# Altium schematic symbol library BARKO_SCHLIB.SchLib: 1064 symbols (part 8 of 11)
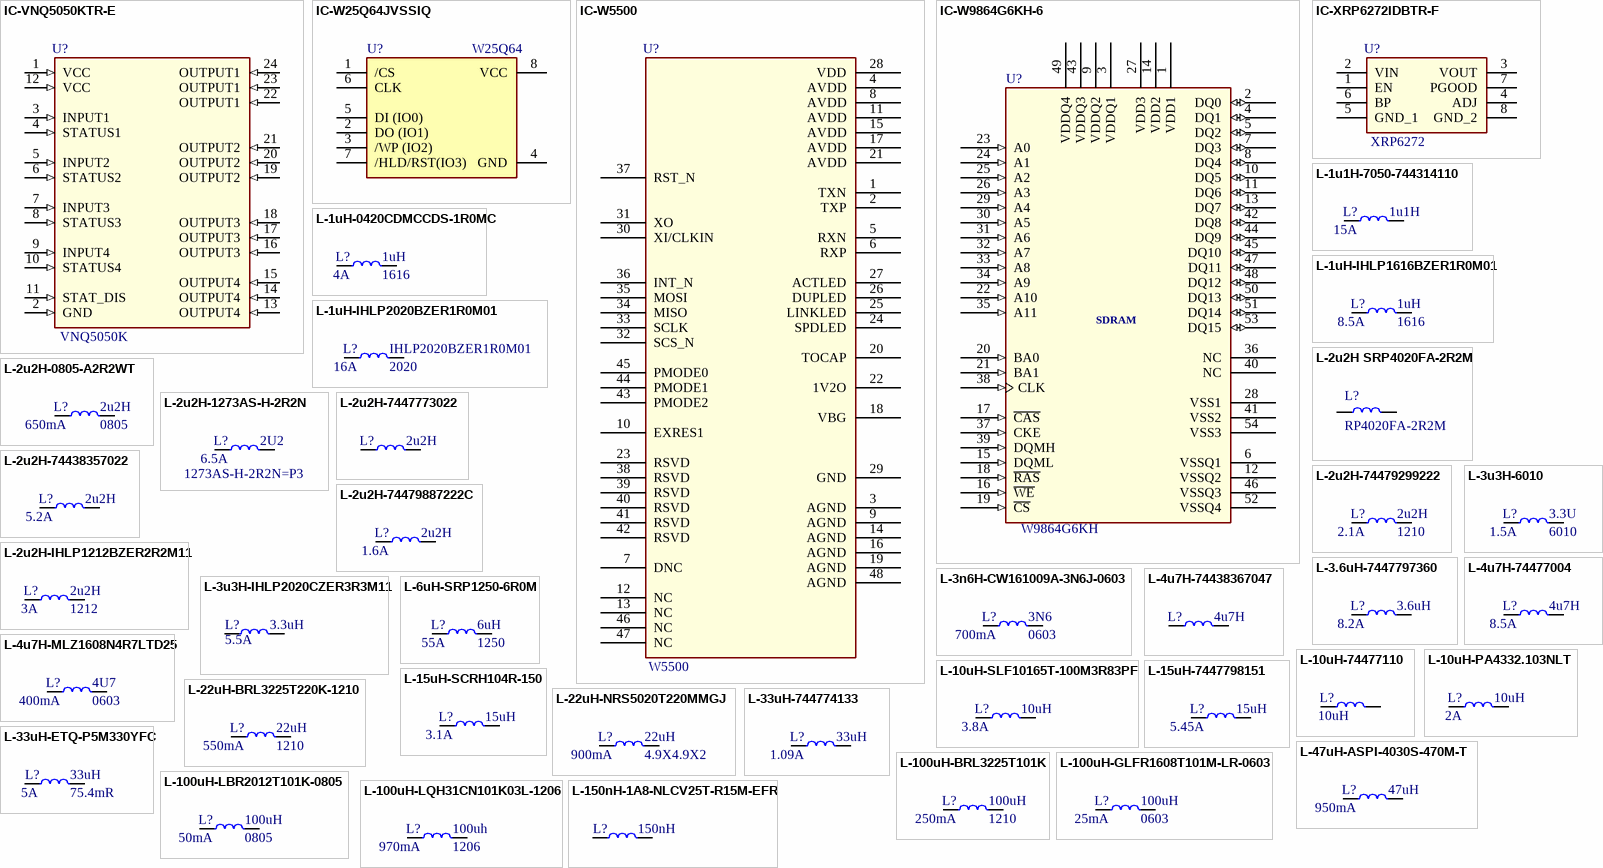
[diagram p48: symbols IC-VNQ5050KTR-E to L-150nH-1A8-NLCV25T-R15M-EFR]

## L-3u3H-IHLP2020CZER3R3M11
designator L?, comment 3.3uH  RMS Current (Irms): 5.5A
Inductor Power Shielded Wirewound 3.3uH 20% 100KHz 5.5A 35mOhm DCR 2020 T/R; Manufacturer: Vishay Dale; Manufacturer Part Number: IHLP2020CZER3R3M11; DC Resistance (DCR): 40.4mR; Saturation Current: 7A; Self Resonant Frequency: 29MHz; Supplier 1: Future Electronics; Stock 1: 8000; Pricing 1: 2000=0,95000 (USD); RoHS: Yes; Mount: Surface Mount; Case/Package: 2020; Contact Plating: Tin; Min Operating Temperature: -55°C; Max Operating Temperature: 125°C; Tolerance: 20%; Inductance: 3.3uH; Inductance Tolerance: 20%; Shielding: Shielded; Package Quantity: 2000; Current Rating: 5.5A; Packaging: Tape and Reel; Test Frequency: 100kHz; Max DC Current: 7A; Termination: SMD/SMT; Military Standard: Not; Length: 5.74mm; Height: 3mm; Depth: 5.43mm; Width: 0.204inch; Height - Seated (Max): 0.118inch; Radiation Hardening: No; Lead Free: Lead Free; REACH SVHC: Unknown; ComponentLink1URL: https://datasheet.ciiva.com/11798/0900766b8102c930-11798349.pdf?src-supplier=RSComponents; ComponentLink1Description: https://datasheet.ciiva.com/11798/0900766b8102c930-11798349.pdf?src-supplier=RSComponents; ComponentLink2URL: https://datasheet.ciiva.com/1051/lp20cz11-1051685.pdf?src-supplier=Digi-Key; ComponentLink2Description: https://datasheet.ciiva.com/1051/lp20cz11-1051685.pdf?src-supplier=Digi-Key; ComponentLink3URL: https://datasheet.ciiva.com/1051/lp20cz11-1051686.pdf?src-supplier=Digi-Key; ComponentLink3Description: https://datasheet.ciiva.com/1051/lp20cz11-1051686.pdf?src-supplier=Digi-Key; ComponentLink4URL: https://datasheet.ciiva.com/3081/lp20cz11-3081961.pdf?src-supplier=Avnet; ComponentLink4Description: https://datasheet.ciiva.com/3081/lp20cz11-3081961.pdf?src-supplier=Avnet; ComponentLink5URL: https://datasheet.ciiva.com/4956/lp20cz11-270739-4956265.pdf?src-supplier=Mouser; ComponentLink5Description: https://datasheet.ciiva.com/4956/lp20cz11-270739-4956265.pdf?src-supplier=Mouser; ComponentLink6URL: https://datasheet.ciiva.com/1051/lp20cz11-1051684.pdf?src-supplier=Digi-Key; ComponentLink6Description: https://datasheet.ciiva.com/1051/lp20cz11-1051684.pdf?src-supplier=Digi-Key; ComponentLink7URL: https://datasheet.ciiva.com/28641/480942-28641646.pdf?src-supplier=Element14; ComponentLink7Description: https://datasheet.ciiva.com/28641/480942-28641646.pdf?src-supplier=Element14; Supplier Part Number 1: IHLP2020CZER3R3M11-REEL
footprint L-IHLP2020CZ (Precision Wire Wound Inductor, 2-Leads, Body 5,49x5,18mm, IPC Medium Density)
pins: 1, 2

## L-4u7H-74477004
designator L?, comment 4u7H  Current Rating: 8.5A
FIXED IND 4.7UH 8.5A 16 MOHM SMD; Manufacturer 1: Wurth Electronics; Manufacturer Part Number: 74477004; Core Material: Ferrite; Saturation Current: 9.3A; Tolerance: 40%; Shielding: Shielded; DC Resistance (DCR): 16mR; Test Frequency: 1kHz; Self Resonant Frequency: 31.2MHz; .Creator: M.OZKAN; .PCBCHK: USED; Supplier 1: Digi-Key; Supplier Part Number 1: 732-1221-1-ND; RoHS: Yes; Category: Fixed Inductors; Stock: 3849; Pricing: 1=2,25000, 10=2,10000, 50=1,95000, 100=1,78000, 250=1,59000 (USD); Mount: Surface Mount; Case/Package: Nonstandard; Number of Pins: 2; Weight: 0.01lb; Min Operating Temperature: -40°C; Max Operating Temperature: 125°C; Package Quantity: 500; Packaging: Cut Tape; Inductance: 4.7uH; Inductance Tolerance: 40%; Composition: Wirewound; Max DC Current: 8.5A; Termination: SMD/SMT; RMS Current (Irms): 8.5A; Resistance: 16mR; Series Resistance: 16mR; Length: 12mm; Height: 8mm; Width: 12mm; Height - Seated (Max): 0.315inch; Depth: 12mm; REACH SVHC: Unknown; Lead Free: Lead Free; ComponentLink1URL: https://datasheet.ciiva.com/6690/74477004-6690625.pdf?src-supplier=Digi-Key; ComponentLink1Description: https://datasheet.ciiva.com/6690/74477004-6690625.pdf?src-supplier=Digi-Key; ComponentLink2URL: https://datasheet.ciiva.com/11800/0900766b80021589-11800145.pdf?src-supplier=RSComponents; ComponentLink2Description: https://datasheet.ciiva.com/11800/0900766b80021589-11800145.pdf?src-supplier=RSComponents; ComponentLink3URL: https://datasheet.ciiva.com/4963/74477004-61358-4963287.pdf?src-supplier=Mouser; ComponentLink3Description: https://datasheet.ciiva.com/4963/74477004-61358-4963287.pdf?src-supplier=Mouser; ComponentLink4URL: https://datasheet.ciiva.com/6171/69559-6171354.pdf?src-supplier=Farnell; ComponentLink4Description: https://datasheet.ciiva.com/6171/69559-6171354.pdf?src-supplier=Farnell; ComponentLink5URL: https://datasheet.ciiva.com/7754/74477004-7754621.pdf?src-supplier=Element14; ComponentLink5Description: https://datasheet.ciiva.com/7754/74477004-7754621.pdf?src-supplier=Element14; .SCHCHK: USED
footprint WE-PD_1280 (SMT Shielded Power Inductor, 2-leads, body 12x12mm)
pins: 1, 2

## L-4u7H-74438367047
designator L?, comment 4u7H
FIXED IND 4.7UH 5.5A 34.5MOHM; Manufacturer: Wurth Electronics; Manufacturer Part Number: 74438367047; Supplier 1: Digi-Key; Supplier Part Number 1: 732-74438367047CT-ND; Stock: 930; Pricing: 1=1.95, 10=1.77, 50=1.62, 100=1.48 (USD); RoHS: No
footprint WE-MAPI_5030 (SMD Power Inductor, 2-leads, body 5.6x5.6mm)
pins: 1, 2

## L-4u7H-MLZ1608N4R7LTD25
designator L?, comment 4U7  Current Rating: 400mA  Case Code (Imperial): 0603
FIXED IND 4.7UH 400MA 416 MOHM; Manufacturer: TDK; Manufacturer Part Number: MLZ1608N4R7LTD25; Core Material: Ferrite; Saturation Current: 80mA; Shielding: Shielded; Tolerance: 20%; DC Resistance (DCR): 416mR; Test Frequency: 2MHz; .Creator: F:TALI; .PCBCHK: USED; Washability: OK; Supplier 1: Digi-Key; Stock 1: 8425; Pricing 1: 1=0.22, 10=0.202, 100=0.1346, 500=0.11212, 1000=0.09419 (USD); Mount: Surface Mount; Case/Package: 0603; Weight: 0.000141oz; Case Code (Metric): 1608; Min Operating Temperature: -55°C; Max Operating Temperature: 125°C; Package Quantity: 4000; Packaging: Tape and Reel; Inductance: 4.7uh; Termination: SMD/SMT; Max DC Current: 400mA; Length: 0.063inch; Height: 0.8mm; Width: 0.031inch; Height - Seated (Max): 0.037inch; Ratings: AEC-Q200; Supplier Part Number 1: 445-17071-6-ND; .SCHCHK: USED
footprint L-0603
pins: 1, 2

## L-6uH-SRP1250-6R0M
designator L?, comment Saturation Current: 55A  Case/Package: 1250  (hidden comment: 6uH)
FIXED IND 6UH 9.5A 10 MOHM SMD; Manufacturer: Bourns; Manufacturer Part Number: SRP1250-6R0M; Core Material: Ferrite; Tolerance: 20%; DC Resistance (DCR): 10mR; Shielding: Shielded; Test Frequency: 100kHz; Current: 36A; .PCBCHK: USED; .Creator: F:TALI; Washability: OK; Supplier 1: Digi-Key; Stock 1: 0; Mount: Surface Mount; Number of Pins: 2; Material: Ferrite; Min Operating Temperature: -55°C; Max Operating Temperature: 150°C; Max DC Current: 9.5A; Package Quantity: 500; Packaging: Tape and Reel; Current Rating: 9.5A; Inductance Tolerance: 20%; Termination: SMD/SMT; RMS Current (Irms): 9.5A; Length: 13.9mm; Height: 5.2mm; Depth: 13.5mm; Width: 13.5mm; Radiation Hardening: No; REACH SVHC: No SVHC; ComponentLink1URL: http://components.arrow.com/part/dataview/45912965S9677445N1506; ComponentLink1Description: http://components.arrow.com/part/dataview/45912965S9677445N1506; ComponentLink2URL: http://bourns.com/pdfs/SRP1250.pdf; ComponentLink2Description: http://bourns.com/pdfs/SRP1250.pdf; ComponentLink3URL: http://www.farnell.com/datasheets/1727865.pdf; ComponentLink3Description: http://www.farnell.com/datasheets/1727865.pdf; ComponentLink4URL: http://www.produktinfo.conrad.com/datenblaetter/1000000-1099999/001056478-da-01-en-MAG_ABG_HC_L_IND_SRP1250_6R0M_6UH_9_5A.pdf; ComponentLink4Description: http://www.produktinfo.conrad.com/datenblaetter/1000000-1099999/001056478-da-01-en-MAG_ABG_HC_L_IND_SRP1250_6R0M_6UH_9_5A.pdf; Supplier Part Number 1: SRP1250-6R0M-ND; .SCHCHK: USED; Inductance: 6uH
footprint L- SRP1250
pins: 1, 2

## L-10uH-74477110
designator L?, comment 10UH
FIXED IND 10UH 5A 25 MOHM SMD; Manufacturer: Wurth Electronics; Manufacturer Part Number: 74477110; Washability: NO; Core Material: Ferrite; Tolerance: 20%; Shielding: Shielded; DC Resistance (DCR): 25mR; Test Frequency: 1kHz; Self Resonant Frequency: 21.5MHz; Saturation Current: 5.5A; Supplier 1: RSComponents; Stock 1: 31; Pricing 1: 1=3.72000, 10=3.45200, 100=2.85700, 500=2.22400, 1000=2.07100, 1=28.61500, 10=26.55000, 100=21.97800, 500=17.11000, 1000=15.93000 (EUR); RoHS: Yes; Mount: Surface Mount; Case/Package: Nonstandard; Weight: 0.01lb; Min Operating Temperature: -40°C; Max Operating Temperature: 125°C; Inductance Tolerance: 20%; Package Quantity: 500; Current Rating: 5A; Packaging: Tape and Reel; Max DC Current: 5A; Termination: SMD/SMT; Resistor Type: Wirewound; RMS Current (Irms): 5A; Resistance: 25mR; Series Resistance: 25mR; Length: 12mm; Width: 12mm; Height: 6mm; Height - Seated (Max): 0.236inch; Depth: 12mm; REACH SVHC: Unknown; ComponentLink1URL: https://datasheet.ciiva.com/11799/0900766b80803d1f-11799696.pdf?src-supplier=RSComponents; ComponentLink1Description: https://datasheet.ciiva.com/11799/0900766b80803d1f-11799696.pdf?src-supplier=RSComponents; ComponentLink2URL: https://datasheet.ciiva.com/1052/74477110-1052269.pdf?src-supplier=Digi-Key; ComponentLink2Description: https://datasheet.ciiva.com/1052/74477110-1052269.pdf?src-supplier=Digi-Key; ComponentLink3URL: https://datasheet.ciiva.com/4954/74477110-62961-4954655.pdf?src-supplier=Mouser; ComponentLink3Description: https://datasheet.ciiva.com/4954/74477110-62961-4954655.pdf?src-supplier=Mouser; Supplier Part Number 1: 6171546; Inductance: 10uH
footprint L-12x12MM (Precision Wire Wound Inductor, 2-Leads, Body 12.00x12.00mm, IPC Medium Density)
pins: 1, 2

## L-10uH-PA4332.103NLT
designator L?, comment 10uH  Current Rating: 2A
FIXED IND 10UH 2A 216 MOHM SMD; Manufacturer: Pulse; Manufacturer Part Number: PA4332.103NLT; Core Material: Ferrite; Tolerance: 20%; Saturation Current: 2.8A; Shielding: Shielded; DC Resistance (DCR): 216mR; Self Resonant Frequency: 11MHz; Test Frequency: 1MHz; Supplier 1: Digi-Key; Supplier Part Number 1: 553-3288-1-ND; Stock: 15210; Pricing: 1=0.56, 10=0.49, 25=0.4552, 50=0.385, 100=0.35, 250=0.329, 500=0.294, 1000=0.238 (USD); RoHS: Yes; Mount: Surface Mount; Case/Package: Nonstandard; Min Operating Temperature: -40°C; Max Operating Temperature: 125°C; Packaging: Tape and Reel; Resistor Type: Wirewound; Inductance: 10uH; Length: 0.165inch; Width: 0.165inch; Height - Seated (Max): 0.079inch; ComponentLink1URL: http://products.pulseelex.com/files/product_files/P761.pdf?src-supplier=Digi-Key; ComponentLink1Description: http://products.pulseelex.com/files/product_files/P761.pdf?src-supplier=Digi-Key
footprint L-PA4332
pins: 1, 2

## L-10uH-SLF10165T-100M3R83PF
designator L?  Inductance: 10uH  Current Rating: 3.8A  (hidden comment: *)
FIXED IND 10UH 3.8A 18.5 MOHM; Manufacturer: TDK; Manufacturer Part Number: SLF10165T-100M3R83PF; Core Material: Ferrite; Saturation Current: 4.1A; Tolerance: 20%; Shielding: Shielded; DC Resistance (DCR): 22.2mR; Test Frequency: 100kHz; Resistance: 0.0222R; .PCBCHK: USED; .Creator: F:TALI; Washability: OK; Supplier 1: Digi-Key; Supplier Part Number 1: 445-6478-6-ND; Stock 1: 11047; Pricing 1: 1=1.33, 10=1.233, 100=0.8918 (USD); Mount: Surface Mount; Min Operating Temperature: -40°C; Max Operating Temperature: 105°C; Packaging: Tape and Reel; Composition: Wirewound; Package Quantity: 500; Max DC Current: 3.8A; Termination: SMD/SMT; Military Standard: Not; Length: 0.398inch; Height: 7mm; Width: 0.398inch; Height - Seated (Max): 0.268inch; Depth: 10.4mm; Lead Free: Lead Free; .SCHCHK: USED; Case/Package: 10.1X10.1X7
footprint L-SLF10165T
pins: 1, 2

## L-15uH-7447798151
designator L?, comment 15uH  Current Rating: 5.45A
FIXED IND 15UH 5.45A 25.8 MOHM; Manufacturer: Wurth Electronics; Manufacturer Part Number: 7447798151; Core Material: Metal,Composite,Ferrite; Self Resonant Frequency: 19MHz; Shielding: Shielded; Inductance Tolerance: 20%; Saturation Current: 4A; Max DC Current: 4.9A; DC Resistance (DCR): 25.8mR; Test Frequency: 100kHz; Supplier 1: Digi-Key; Supplier Part Number 1: 732-2416-1-ND; Stock: 1954; Pricing: 1=3.34, 10=3.086, 50=2.979, 100=2.873, 250=2.554 (USD); RoHS: Yes; Mount: Surface Mount; Case/Package: Nonstandard; Min Operating Temperature: -40°C; Max Operating Temperature: 150°C; Inductance: 15uH; Tolerance: 20%; Package Quantity: 500; Packaging: Tape and Reel; Termination: SMD/SMT; Resistor Type: Wirewound; RMS Current (Irms): 5.45A; Length: 10.2mm; Height: 6.4mm; Width: 10.2mm; Height - Seated (Max): 0.252inch; Depth: 10.2mm; Lead Pitch: 5.8mm; REACH SVHC: Unknown; ComponentLink1URL: https://datasheet.ciiva.com/4954/7447798151-38869-4954752.pdf?src-supplier=Mouser; ComponentLink1Description: https://datasheet.ciiva.com/4954/7447798151-38869-4954752.pdf?src-supplier=Mouser; ComponentLink2URL: https://datasheet.ciiva.com/6045/530548-6045139.pdf?src-supplier=Farnell; ComponentLink2Description: https://datasheet.ciiva.com/6045/530548-6045139.pdf?src-supplier=Farnell; ComponentLink3URL: https://datasheet.ciiva.com/11801/0900766b80febee1-11801973.pdf?src-supplier=RSComponents; ComponentLink3Description: https://datasheet.ciiva.com/11801/0900766b80febee1-11801973.pdf?src-supplier=RSComponents; ComponentLink4URL: https://datasheet.ciiva.com/6697/7447798151-6697980.pdf?src-supplier=Digi-Key; ComponentLink4Description: https://datasheet.ciiva.com/6697/7447798151-6697980.pdf?src-supplier=Digi-Key; ComponentLink5URL: https://datasheet.ciiva.com/7892/7447798151-7892956.pdf?src-supplier=Element14; ComponentLink5Description: https://datasheet.ciiva.com/7892/7447798151-7892956.pdf?src-supplier=Element14; ComponentLink6URL: https://datasheet.ciiva.com/6697/7447798151-6697981.pdf?src-supplier=Digi-Key; ComponentLink6Description: https://datasheet.ciiva.com/6697/7447798151-6697981.pdf?src-supplier=Digi-Key; ComponentLink7URL: https://datasheet.ciiva.com/6697/7447798151-6697982.pdf?src-supplier=Digi-Key; ComponentLink7Description: https://datasheet.ciiva.com/6697/7447798151-6697982.pdf?src-supplier=Digi-Key
footprint WE-PDF_1064 (SMD Shielded Power Inductor, body 10.2x10.2mm)
pins: 1, 2

## L-15uH-SCRH104R-150
designator L?, comment 15uH  Current Rating: 3.1A
FIXED IND 15UH 3.1A 50 MOHM SMD; Manufacturer 1: Bel Signal; Manufacturer Part Number 1: SCRH104R-150; DC Resistance (DCR): 50mR; Test Frequency: 100kHz; Saturation Current: 3.6A; Tolerance: 30%; Shielding: Shielded; Alternate: SRI1004-150M; Washability: OK; .Creator: M.OZKAN; .PCBCHK: USED; Supplier 1: Digi-Key; Stock 1: 1223; Pricing 1: 1=0.88000, 10=0.81700, 100=0.59060 (USD); RoHS: Yes; Mount: Surface Mount; Case/Package: Nonstandard; Min Operating Temperature: -40°C; Max Operating Temperature: 125°C; Inductance: 15uH; Package Quantity: 800; Packaging: Tape and Reel; Length: 0.413inch; Height - Seated (Max): 0.157inch; Width: 0.406inch; ComponentLink1URL: https://datasheet.ciiva.com/1055/p150-scrh104r-1055053.pdf?src-supplier=Digi-Key; ComponentLink1Description: https://datasheet.ciiva.com/1055/p150-scrh104r-1055053.pdf?src-supplier=Digi-Key; ComponentLink2URL: https://datasheet.ciiva.com/1055/p150-scrh104r-1055054.pdf?src-supplier=Digi-Key; ComponentLink2Description: https://datasheet.ciiva.com/1055/p150-scrh104r-1055054.pdf?src-supplier=Digi-Key; ComponentLink3URL: https://datasheet.ciiva.com/1055/p150-scrh104r-1055055.pdf?src-supplier=Digi-Key; ComponentLink3Description: https://datasheet.ciiva.com/1055/p150-scrh104r-1055055.pdf?src-supplier=Digi-Key; Supplier Part Number 1: 595-1411-1-ND; .SCHCHK: USED
footprint L-10mmX10mm
pins: 1, 2

## L-22uH-BRL3225T220K-1210
designator L?  Inductance: 22uH  Saturation Current: 550mA  Case Code (Imperial): 1210  (hidden comment: *)
FIXED IND 22UH 470MA 828 MOHM; Manufacturer: Taiyo Yuden; Manufacturer Part Number: BRL3225T220K; Core Material: Ferrite; Tolerance: 10%; Shielding: Unshielded; Self Resonant Frequency: 13MHz; DC Resistance (DCR): 690mR; Test Frequency: 100kHz; Resistance: 0.69R; .PCBCHK: USED; .Creator: F:TALI; Washability: OK; Supplier 1: Digi-Key; Supplier Part Number 1: 587-2168-6-ND; Stock 1: 1723; Pricing 1: 1=0.28, 10=0.253, 100=0.1739, 500=0.14864, 1000=0.11385 (USD); Mount: Surface Mount; Case/Package: 1210; Number of Pins: 2; Case Code (Metric): 3225; Min Operating Temperature: -40°C; Max Operating Temperature: 105°C; Package Quantity: 2000; Current Rating: 470mA; Packaging: Tape and Reel; Inductance Tolerance: 10%; Composition: Wirewound; Max DC Current: 550mA; Termination: SMD/SMT; Length: 0.126inch; Height: 1.7mm; Width: 0.098inch; Height - Seated (Max): 0.067inch; Depth: 2.7mm; Radiation Hardening: No; REACH SVHC: No SVHC; Halogen Free: Halogen Free; ComponentLink1URL: http://www.yuden.co.jp/productdata/catalog/en/wound07_e.pdf; ComponentLink1Description: http://www.yuden.co.jp/productdata/catalog/en/wound07_e.pdf; ComponentLink2URL: http://ds.yuden.co.jp/TYCOMPAS/ut/detail.do?productNo=BRL3225T220K&fileName=BRL3225T220K_SS&mode=specSheetDownload; ComponentLink2Description: http://ds.yuden.co.jp/TYCOMPAS/ut/detail.do?productNo=BRL3225T220K&fileName=BRL3225T220K_SS&mode=specSheetDownload; .SCHCHK: USED
footprint L-1210
pins: 1, 2

## L-22uH-NRS5020T220MMGJ
designator L?, comment Case/Package: 4.9X4.9X2  Saturation Current: 900mA  (hidden comment: 22uH)
FIXED IND 22UH 1A 312 MOHM SMD; Manufacturer: Taiyo Yuden; Manufacturer Part Number: NRS5020T220MMGJ; Core Material: Ferrite; Tolerance: 20%; DC Resistance (DCR): 260mR; Shielding: Shielded; Self Resonant Frequency: 17MHz; Test Frequency: 100kHz; .PCBCHK: USED; .Creator: F:TALI; Washability: OK; Supplier 1: Digi-Key; Supplier Part Number 1: 587-2411-2-ND; Stock 1: 5600; Pricing 1: 800=0.13923, 1600=0.11934, 4000=0.11271, 5600=0.10608, 20000=0.10277, 40000=0.09945, 80000=0.09614 (USD); Mount: Surface Mount; Number of Pins: 2; Min Operating Temperature: -25°C; Max Operating Temperature: 125°C; Max DC Current: 900mA; Package Quantity: 800; Current Rating: 1A; Packaging: Tape and Reel; Composition: Wirewound; Termination: SMD/SMT; Inductance Tolerance: 20%; RMS Current (Irms): 1A; Length: 4.9mm; Height: 2mm; Width: 0.193inch; Height - Seated (Max): 0.079inch; Depth: 5.1mm; Lead Pitch: 3.3mm; Radiation Hardening: No; Halogen Free: Halogen Free; Lead Free: Lead Free; REACH SVHC: Unknown; ComponentLink1URL: http://www.yuden.co.jp/productdata/catalog/en/wound04_e.pdf; ComponentLink1Description: http://www.yuden.co.jp/productdata/catalog/en/wound04_e.pdf; ComponentLink2URL: http://documents.rs-components.com/techlib://itc_doclist_GB.htm?stockno=7557070; ComponentLink2Description: http://documents.rs-components.com/techlib://itc_doclist_GB.htm?stockno=7557070; ComponentLink3URL: https://www.yuden.co.jp/productdata/catalog/en/wound04_e.pdf; ComponentLink3Description: https://www.yuden.co.jp/productdata/catalog/en/wound04_e.pdf; .SCHCHK: USED; Inductance: 22uH
footprint L- NRS5020T1R5NMGJ
pins: 1, 2

## L-33uH-744774133
designator L?, comment Current Rating: 1.09A  (hidden comment: 33uH)
FIXED IND 33UH 1.09A 230 MOHM; Manufacturer: Wurth Electronics; Manufacturer Part Number: 744774133; Core Material: Ferrite; Self Resonant Frequency: 14MHz; Tolerance: 15%; Shielding: Unshielded; Saturation Current: 1.17A; Resistance: 230mR; Test Frequency: 10kHz; .PCBCHK: USED; .Creator: F:TALI; Washability: OK; Supplier 1: Digi-Key; Supplier Part Number 1: 732-1274-6-ND; Stock 1: 5698; Pricing 1: 1=1.76, 10=1.68, 50=1.512, 100=1.4, 250=1.344, 500=1.232 (USD); Mount: Surface Mount; Min Operating Temperature: -40°C; Max Operating Temperature: 125°C; Package Quantity: 1; Packaging: Cut Tape; Inductance Tolerance: 15%; Max DC Current: 1.09A; DC Resistance (DCR): 230mR; Termination: SMD/SMT; Composition: Wirewound; RMS Current (Irms): 1.09A; Length: 0.228inch; Height: 4.5mm; Width: 5.2mm; Height - Seated (Max): 0.191inch; REACH SVHC: Unknown; Lead Free: Lead Free; ComponentLink1URL: http://www.mouser.com/ds/2/445/744774133-539244.pdf; ComponentLink1Description: http://www.mouser.com/ds/2/445/744774133-539244.pdf; ComponentLink2URL: http://www.farnell.com/datasheets/1736373.pdf; ComponentLink2Description: http://www.farnell.com/datasheets/1736373.pdf; ComponentLink3URL: http://katalog.we-online.de/kataloge/eisos/media/pdf/744774133.pdf; ComponentLink3Description: http://katalog.we-online.de/kataloge/eisos/media/pdf/744774133.pdf; ComponentLink4URL: http://katalog.we-online.de/pbs/datasheet/744774133.pdf; ComponentLink4Description: http://katalog.we-online.de/pbs/datasheet/744774133.pdf; .SCHCHK: USED; Case/Package: 5.2X4.5X4.5; Inductance: 33uH
pins: 1, 2

## L-33uH-ETQ-P5M330YFC
designator L?  DC Resistance (DCR): 75.4mR  Inductance: 33uH  Current Rating: 5A  (hidden comment: *)
FIXED IND 33UH 5A 75.4 MOHM SMD; Manufacturer: Panasonic; Manufacturer Part Number: ETQ-P5M330YFC; Core Material: Metal,Composite; Saturation Current: 7.6A; Shielding: Shielded; Test Frequency: 100kHz; Max DC Current: 6.5A; Tolerance: 20%; Washability: OK; .Creator: M.OZKAN; .PCBCHK: USED; Supplier 1: Digi-Key; Stock 1: 4443; Pricing 1: 1=1,73000, 10=1,60700, 100=1,16210 (USD); RoHS: Yes; Mount: Surface Mount; Case/Package: Nonstandard; Min Operating Temperature: -40°C; Max Operating Temperature: 150°C; Packaging: Tape and Reel; Composition: Wirewound; Self Resonant Frequency: 100kHz; Length: 0.421inch; Height: 5mm; Width: 0.394inch; Height - Seated (Max): 0.213inch; Depth: 10mm; Ratings: AEC-Q200; Lead Free: Lead Free; ComponentLink1URL: http://www.farnell.com/datasheets/2367575.pdf?src-supplier=Farnell; ComponentLink1Description: http://www.farnell.com/datasheets/2367575.pdf?src-supplier=Farnell; ComponentLink2URL: https://media.digikey.com/pdf/Data%20Sheets/Panasonic%20Inductors%20Coils%20Filters%20PDFs/Various_ETQ_Series_NPI.pdf?src-supplier=Digi-Key; ComponentLink2Description: https://media.digikey.com/pdf/Data%20Sheets/Panasonic%20Inductors%20Coils%20Filters%20PDFs/Various_ETQ_Series_NPI.pdf?src-supplier=Digi-Key; ComponentLink3URL: http://uk.rs-online.com/webdocs/0bef/0900766b80befc95.pdf?src-supplier=RSComponents; ComponentLink3Description: http://uk.rs-online.com/webdocs/0bef/0900766b80befc95.pdf?src-supplier=RSComponents; ComponentLink4URL: https://industrial.panasonic.com/cdbs/www-data/pdf/AGL0000/AGL0000COL38.pdf?src-supplier=Digi-Key; ComponentLink4Description: https://industrial.panasonic.com/cdbs/www-data/pdf/AGL0000/AGL0000COL38.pdf?src-supplier=Digi-Key; Supplier Part Number 1: PCD2434CT-ND; .SCHCHK: USED
pins: 1, 2

## L-47uH-ASPI-4030S-470M-T
designator L?  Inductance: 47uH  Saturation Current: 950mA  (hidden comment: *)
FIXED IND 47UH 720MA 445 MOHM; Manufacturer: Abracon; Manufacturer Part Number: ASPI-4030S-470M-T; Core Material: Ferrite; Shielding: Shielded; Tolerance: 20%; DC Resistance (DCR): 445mR; Test Frequency: 100kHz; Self Resonant Frequency: 8.4MHz; .PCBCHK: USED; .Creator: F:TALI; Washability: OK; Supplier 1: Digi-Key; Supplier Part Number 1: 535-12321-6-ND; Stock 1: 0; Pricing 1: 1=0.51, 10=0.443, 100=0.3163, 500=0.26566, 1000=0.21505 (USD); Mount: Surface Mount; Min Operating Temperature: -40°C; Max Operating Temperature: 125°C; Packaging: Tape and Reel; Current Rating: 720mA; Max DC Current: 950mA; Composition: Wirewound; Termination: SMD/SMT; Package Quantity: 2000; Length: 0.157inch; Height: 3mm; Width: 4mm; Height - Seated (Max): 0.118inch; ComponentLink1URL: http://www.abracon.com/Magnetics/power/ASPI-4030S.pdf; ComponentLink1Description: http://www.abracon.com/Magnetics/power/ASPI-4030S.pdf; ComponentLink2URL: https://abracon.com/Support/PackageDrawing/Magnetics/ASPI-4030S.PDF; ComponentLink2Description: https://abracon.com/Support/PackageDrawing/Magnetics/ASPI-4030S.PDF; .SCHCHK: USED; Case/Package: 8X8X4.2
footprint L-ASPI-4030S
pins: 1, 2

## L-100uH-BRL3225T101K
designator L?, comment 100uH  Max DC Current: 250mA  Case/Package: 1210
FIXED IND 100UH 250MA 3 OHM SMD; Manufacturer: Taiyo Yuden; Manufacturer Part Number: BRL3225T101K; Core Material: Ferrite; Tolerance: 10%; Self Resonant Frequency: 5MHz; Saturation Current: 270mA; Shielding: Unshielded; DC Resistance (DCR): 2.5R; Test Frequency: 100kHz; .Creator: M.OZKAN; .PCBCHK: USED; Supplier 1: Digi-Key; Supplier Part Number 1: 587-2170-1-ND; Stock: 421; Pricing: 1=0.28, 10=0.253, 100=0.1739, 500=0.1486, 1000=0.1139 (USD); RoHS: Yes; Mount: Surface Mount; Number of Pins: 2; Case Code (Metric): 3225; Case Code (Imperial): 1210; Min Operating Temperature: -40°C; Max Operating Temperature: 105°C; Termination: SMD/SMT; Packaging: Tape and Reel; Inductance Tolerance: 10%; Package Quantity: 2000; Current Rating: 250mA; Composition: Wirewound; Inductance: 100uH; Length: 0.126inch; Height: 1.7mm; Height - Seated (Max): 0.067inch; Depth: 2.7mm; Width: 0.098inch; Radiation Hardening: No; Halogen Free: Halogen Free; REACH SVHC: Unknown; ComponentLink1URL: https://datasheet.ciiva.com/7648/1598571-7648357.pdf?src-supplier=Element14; ComponentLink1Description: https://datasheet.ciiva.com/7648/1598571-7648357.pdf?src-supplier=Element14; ComponentLink2URL: https://datasheet.ciiva.com/7291/brl3225t101k-ss-7291482.pdf?src-supplier=Newark; ComponentLink2Description: https://datasheet.ciiva.com/7291/brl3225t101k-ss-7291482.pdf?src-supplier=Newark; ComponentLink3URL: https://datasheet.ciiva.com/15981/679brl3225t101k-15981651.pdf?src-supplier=Onlinecomponents.com; ComponentLink3Description: https://datasheet.ciiva.com/15981/679brl3225t101k-15981651.pdf?src-supplier=Onlinecomponents.com; ComponentLink4URL: https://datasheet.ciiva.com/8504/wound07-e-8504025.pdf?src-supplier=Avnet; ComponentLink4Description: https://datasheet.ciiva.com/8504/wound07-e-8504025.pdf?src-supplier=Avnet; ComponentLink5URL: https://datasheet.ciiva.com/1040/wound07-e-1040618.pdf?src-supplier=Digi-Key; ComponentLink5Description: https://datasheet.ciiva.com/1040/wound07-e-1040618.pdf?src-supplier=Digi-Key; ComponentLink6URL: https://datasheet.ciiva.com/1040/wound07-e-1040619.pdf?src-supplier=Digi-Key; ComponentLink6Description: https://datasheet.ciiva.com/1040/wound07-e-1040619.pdf?src-supplier=Digi-Key; ComponentLink7URL: https://datasheet.ciiva.com/1040/wound07-e-1040617.pdf?src-supplier=Digi-Key; ComponentLink7Description: https://datasheet.ciiva.com/1040/wound07-e-1040617.pdf?src-supplier=Digi-Key; .SCHCHK: USED
footprint L-1210
pins: 1, 2

## L-100uH-GLFR1608T101M-LR-0603
designator L?, comment Current Rating: 25mA  Case Code (Imperial): 0603  (hidden comment: 100uH)
FIXED IND 100UH 80MA 5.5 OHM SMD; Manufacturer: TDK; Manufacturer Part Number: GLFR1608T101M-LR; Tolerance: 20%; Shielding: Shielded; DC Resistance (DCR): 5.5R; .PCBCHK: USED; .Creator: F:TALI; Washability: OK; Supplier 1: Digi-Key; Supplier Part Number 1: 445-6150-6-ND; Stock 1: 134247; Pricing 1: 1=0.27, 10=0.244, 100=0.1676, 500=0.14324, 1000=0.10971 (USD); Mount: Surface Mount; Case/Package: 0603; Case Code (Metric): 1608; Min Operating Temperature: -40°C; Max Operating Temperature: 105°C; Packaging: Tape and Reel; Package Quantity: 4000; Saturation Current: 25mA; Max DC Current: 80mA; Termination: SMD/SMT; DC Current: 80mA; Military Standard: Not; Length: 0.063inch; Height: 0.031inch; Width: 0.8mm; Depth: 1mm; Lead Free: Lead Free; ComponentLink1URL: https://media.digikey.com/pdf/Data%20Sheets/TDK%20PDFs/GLFR%20Series.pdf; ComponentLink1Description: https://media.digikey.com/pdf/Data%20Sheets/TDK%20PDFs/GLFR%20Series.pdf; .SCHCHK: USED; Inductance: 100uH
footprint L-0603
pins: 1, 2

## L-100uH-LBR2012T101K-0805
designator L?, comment Case Code (Imperial): 0805  Current Rating: 50mA  (hidden comment: 100uH)
FIXED IND 100UH 50MA 4 OHM SMD; Manufacturer: Taiyo Yuden; Manufacturer Part Number: LBR2012T101K; Core Material: Ferrite; Tolerance: 10%; Shielding: Unshielded; DC Resistance (DCR): 4R; Self Resonant Frequency: 8MHz; Test Frequency: 796kHz; .PCBCHK: USED; .Creator: F:TALI; Washability: OK; Supplier 1: Digi-Key; Supplier Part Number 1: 587-2048-6-ND; Stock 1: 51580; Pricing 1: 1=0.11, 10=0.098, 100=0.0656, 500=0.05462, 1000=0.04589 (USD); Mount: Surface Mount; Case/Package: 0805; Weight: 0.000194oz; Case Code (Metric): 2012; Min Operating Temperature: -40°C; Max Operating Temperature: 105°C; Package Quantity: 3000; Packaging: Tape and Reel; Max DC Current: 50mA; Composition: Wirewound; Termination: SMD/SMT; DC Current: 50mA; Military Standard: Not; Inductance Tolerance: 10%; Length: 0.079inch; Height: 1.6mm; Width: 1.6mm; Height - Seated (Max): 0.057inch; Depth: 1.45mm; Lead Pitch: 1mm; Radiation Hardening: No; Lead Free: Lead Free; Halogen Free: Halogen Free; REACH SVHC: Unknown; ComponentLink1URL: https://www.yuden.co.jp/productdata/catalog/en/wound01_e.pdf; ComponentLink1Description: https://www.yuden.co.jp/productdata/catalog/en/wound01_e.pdf; ComponentLink2URL: https://www.verical.com/server-webapp/html/getDatasheet?partID=637496; ComponentLink2Description: https://www.verical.com/server-webapp/html/getDatasheet?partID=637496; ComponentLink3URL: http://ds.yuden.co.jp/TYCOMPAS/ut/detail.do?productNo=LBR2012T101K&dataUnit=M; ComponentLink3Description: http://ds.yuden.co.jp/TYCOMPAS/ut/detail.do?productNo=LBR2012T101K&dataUnit=M; ComponentLink4URL: http://www.farnell.com/datasheets/1497259.pdf; ComponentLink4Description: http://www.farnell.com/datasheets/1497259.pdf; .SCHCHK: USED; Inductance: 100uH
footprint L-0805
pins: 1, 2

## L-100uH-LQH31CN101K03L-1206
designator L?, comment Current: 970mA  Case Code (Imperial): 1206  (hidden comment: 100uH)
FIXED IND 100UH 80MA 12 OHM SMD; Manufacturer: Murata; Manufacturer Part Number: LQH31CN101K03L; Core Material: Ferrite; Tolerance: 10%; Shielding: Unshielded; Self Resonant Frequency: 7MHz; DC Resistance (DCR): 12R; Test Frequency: 1MHz; .PCBCHK: USED; .Creator: F:TALI; Washability: OK; Supplier 1: Digi-Key; Supplier Part Number 1: 490-6589-6-ND; Stock 1: 82070; Pricing 1: 1=0.78, 10=0.685, 100=0.4891, 500=0.4108, 1000=0.33255 (USD); Mount: Surface Mount; Case/Package: 1206; Number of Pins: 2; Weight: 0.001023oz; Case Code (Metric): 3216; Min Operating Temperature: -40°C; Max Operating Temperature: 85°C; Max DC Current: 80mA; Package Quantity: 2000; Current Rating: 80mA; Packaging: Tape and Reel; Inductance Tolerance: 10%; Termination: SMD/SMT; DC Current: 80mA; Military Standard: Not; Length: 0.125inch; Height: 0.071inch; Depth: 1.8mm; Width: 0.063inch; Radiation Hardening: No; REACH SVHC: No SVHC; ComponentLink1URL: http://search.murata.co.jp/Ceramy/image/img/P02/JELF243A-0031.pdf; ComponentLink1Description: http://search.murata.co.jp/Ceramy/image/img/P02/JELF243A-0031.pdf; ComponentLink2URL: http://uk.rs-online.com/webdocs/0f10/0900766b80f1087b.pdf; ComponentLink2Description: http://uk.rs-online.com/webdocs/0f10/0900766b80f1087b.pdf; ComponentLink3URL: http://www.farnell.com/datasheets/5131.pdf; ComponentLink3Description: http://www.farnell.com/datasheets/5131.pdf; ComponentLink4URL: http://www.mouser.com/ds/2/281/o05e-522697.pdf; ComponentLink4Description: http://www.mouser.com/ds/2/281/o05e-522697.pdf; ComponentLink5URL: http://search.murata.co.jp/Ceramy/image/img/PDF/ENG/L0075S0093LQH31C.pdf; ComponentLink5Description: http://search.murata.co.jp/Ceramy/image/img/PDF/ENG/L0075S0093LQH31C.pdf; ComponentLink6URL: http://components.arrow.com/part/dataview/39134458S7865423N2606; ComponentLink6Description: http://components.arrow.com/part/dataview/39134458S7865423N2606; .SCHCHK: USED; Inductance: 100uh
footprint L-1206
pins: 1, 2

## L-150nH-1A8-NLCV25T-R15M-EFR
designator L?, comment 150nH
Surface Mount High Frequency Inductor, NLCV Series, 150 nH, 20%, 1008 [2520 Metric], 500 MHz RoHS Compliant: Yes; Manufacturer: TDK; Manufacturer Part Number: NLCV25T-R15M-EFR; Core Material: Ferrite; Current Rating: 1.8A; Shielding: Unshielded; DC Resistance (DCR): 44mR; Self Resonant Frequency: 500MHz; Test Frequency: 25.2MHz; Supplier 1: Mouser; Stock 1: 3740; Pricing 1: 1=0,28000, 10=0,19200, 100=0,17800, 500=0,15600, 1000=0,12600, 2000=0,08800 (USD); RoHS: Yes; Mount: Surface Mount; Case/Package: 1008; Case Code (Imperial): 1008; Case Code (Metric): 2520; Min Operating Temperature: -40°C; Max Operating Temperature: 105°C; Packaging: Cut Tape; Tolerance: 20%; Composition: Wirewound; Inductance: 150nH; Inductance Tolerance: 20%; Termination: SMD/SMT; Package Quantity: 2000; Max DC Current: 1.8A; Length: 0.098inch; Height: 1.8mm; Width: 0.079inch; Height - Seated (Max): 0.075inch; REACH SVHC: No SVHC; ComponentLink1URL: https://datasheet.ciiva.com/41835/inductor-commercial-decoupling-nlcv-en-41835749.pdf?src-supplier=Digi-Key; ComponentLink1Description: https://datasheet.ciiva.com/41835/inductor-commercial-decoupling-nlcv-en-41835749.pdf?src-supplier=Digi-Key; Supplier Part Number 1: 810-NLCV25T-R15M-EFR
footprint L-NLCV25-EFR (TDK NLCV25-EFR Series)
pins: 1, 2

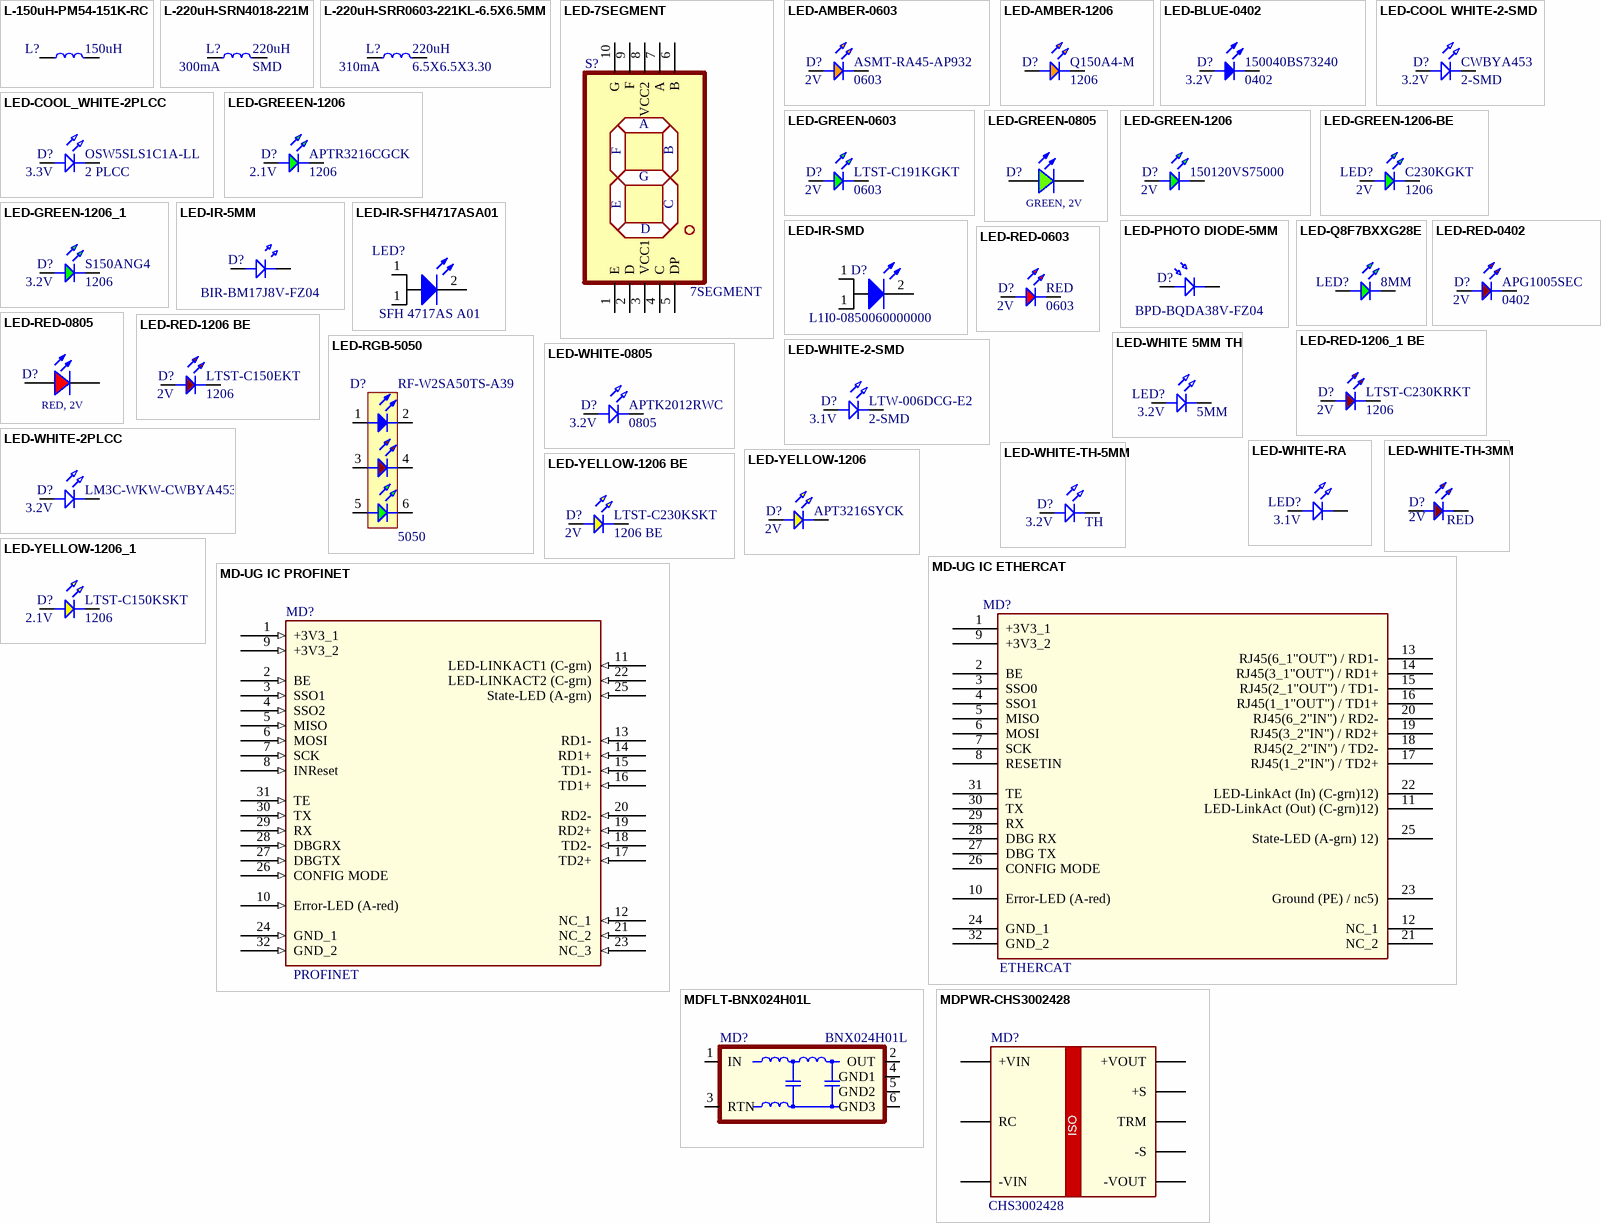
[diagram p32: symbols L-150uH-PM54-151K-RC to MDPWR-CHS3002428]

## L-150uH-PM54-151K-RC
designator L?, comment 150uH
Fixed Inductors 150uH 10%; Manufacturer: Bourns; Manufacturer Part Number: PM54-151K-RC; Core Material: Ferrite; Self Resonant Frequency: 6MHz; Current Rating: 400mA; Saturation Current: 540mA; Shielding: Unshielded; DC Resistance (DCR): 1.1R; Test Frequency: 1kHz; Q Factor: 20; Supplier 1: Arrow; Stock 1: 1526; Pricing 1: 1=0,57900, 10=0,56010, 25=0,54660, 100=0,48370, 250=0,45470, 500=0,41490, 1000=0,39480, 1500=0,39600, 15000=0,39050, 150000=0,35760, 750000=0,33830, 1500000=0,33800 (USD); RoHS: Yes; Mount: Surface Mount; Case/Package: Nonstandard; Number of Pins: 2; Min Operating Temperature: -40°C; Max Operating Temperature: 125°C; Tolerance: 10%; Packaging: Tape and Reel; Package Quantity: 1500; Inductance: 150uH; Max DC Current: 400mA; Composition: Wirewound; Termination: SMD/SMT; Inductance Tolerance: 10%; DC Current: 400mA; Military Standard: Not; RMS Current (Irms): 400mA; Length: 0.228inch; Height: 4.8mm; Width: 5.2mm; Height - Seated (Max): 0.189inch; Radiation Hardening: No; Lead Free: Lead Free; REACH SVHC: No SVHC; ComponentLink1URL: https://datasheet.ciiva.com/30098/pm54-series-30098501.pdf?src-supplier=Onlinecomponents.com; ComponentLink1Description: https://datasheet.ciiva.com/30098/pm54-series-30098501.pdf?src-supplier=Onlinecomponents.com; ComponentLink2URL: https://datasheet.ciiva.com/6689/pm54-series-6689655.pdf?src-supplier=Digi-Key; ComponentLink2Description: https://datasheet.ciiva.com/6689/pm54-series-6689655.pdf?src-supplier=Digi-Key; ComponentLink3URL: https://datasheet.ciiva.com/8513/pm54-series-8513415.pdf?src-supplier=Avnet; ComponentLink3Description: https://datasheet.ciiva.com/8513/pm54-series-8513415.pdf?src-supplier=Avnet; ComponentLink4URL: https://datasheet.ciiva.com/22666/1731394-22666971.pdf?src-supplier=Element14; ComponentLink4Description: https://datasheet.ciiva.com/22666/1731394-22666971.pdf?src-supplier=Element14; ComponentLink5URL: https://datasheet.ciiva.com/22666/1731394-22666972.pdf?src-supplier=Element14; ComponentLink5Description: https://datasheet.ciiva.com/22666/1731394-22666972.pdf?src-supplier=Element14; ComponentLink6URL: https://datasheet.ciiva.com/4966/pm54-series-58216-4966053.pdf?src-supplier=Mouser; ComponentLink6Description: https://datasheet.ciiva.com/4966/pm54-series-58216-4966053.pdf?src-supplier=Mouser; ComponentLink7URL: https://datasheet.ciiva.com/6689/pm54-series-6689672.pdf?src-supplier=Digi-Key; ComponentLink7Description: https://datasheet.ciiva.com/6689/pm54-series-6689672.pdf?src-supplier=Digi-Key; ComponentLink8URL: https://datasheet.ciiva.com/6689/pm54-series-6689673.pdf?src-supplier=Digi-Key; ComponentLink8Description: https://datasheet.ciiva.com/6689/pm54-series-6689673.pdf?src-supplier=Digi-Key; Supplier Part Number 1: PM54-151K-RC
footprint L- Bourns -PM54 (Precision Wire Wound Inductor, 2-Leads, Body 5,80x5,80mm, IPC Medium Density)
pins: 1, 2

## L-220uH-SRN4018-221M
designator L?, comment Case/Package: SMD  Saturation Current: 300mA  (hidden comment: 220uH)
FIXED IND 220UH 280MA 3.552 OHM; Manufacturer: Bourns; Manufacturer Part Number: SRN4018-221M; Core Material: Ferrite; Material: Steel; Tolerance: 20%; Shielding: Shielded; DC Resistance (DCR): 3.552R; Self Resonant Frequency: 3MHz; Test Frequency: 100kHz; .PCBCHK: USED; .Creator: F:TALI; Washability: OK; Supplier 1: Digi-Key; Supplier Part Number 1: SRN4018-221MDKR-ND; Stock 1: 35445; Pricing 1: 1=0.46, 10=0.403, 100=0.2875, 500=0.2415, 1000=0.1955 (USD); Mount: Surface Mount; Number of Pins: 2; Min Operating Temperature: -25°C; Max Operating Temperature: 120°C; Package Quantity: 3000; Packaging: Tape and Reel; Max DC Current: 280mA; Termination: SMD/SMT; Current Rating: 280mA; Inductance Tolerance: 20%; Composition: Wirewound; DC Current: 280mA; Military Standard: Not; RMS Current (Irms): 280mA; Length: 4mm; Height: 1.8mm; Width: 4mm; Depth: 4.2mm; Height - Seated (Max): 0.071inch; REACH SVHC: No SVHC; ComponentLink1URL: https://www.bourns.com/docs/Product-Datasheets/SRN4018.pdf; ComponentLink1Description: https://www.bourns.com/docs/Product-Datasheets/SRN4018.pdf; ComponentLink2URL: https://www.alliedelec.com/m/d/dd1c9725060a5800d35900a7fd6620e8.pdf; ComponentLink2Description: https://www.alliedelec.com/m/d/dd1c9725060a5800d35900a7fd6620e8.pdf; ComponentLink3URL: http://www.bourns.com/docs/Product-Datasheets/SRN4018.pdf; ComponentLink3Description: http://www.bourns.com/docs/Product-Datasheets/SRN4018.pdf; ComponentLink4URL: http://www.farnell.com/datasheets/1684089.pdf; ComponentLink4Description: http://www.farnell.com/datasheets/1684089.pdf; ComponentLink5URL: http://www.mouser.com/ds/2/54/rn4018-778397.pdf; ComponentLink5Description: http://www.mouser.com/ds/2/54/rn4018-778397.pdf; .SCHCHK: USED; Inductance: 220uH
footprint L-SRN4018
pins: 1, 2

## L-220uH-SRR0603-221KL-6.5X6.5MM
designator L?, comment Case Code (Imperial): 6.5X6.5X3.30  Saturation Current: 310mA  (hidden comment: 220uH)
FIXED IND 220UH 200MA 2.7 OHM; Manufacturer: Bourns; Manufacturer Part Number: SRR0603-221KL; Core Material: Ferrite; Material: Steel; Tolerance: 10%; DC Resistance (DCR): 2.7R; Frequency: 5MHz; Q Factor: 20; Shielding: Shielded; Resistance: 2.7MR; Test Frequency: 1kHz; .PCBCHK: USED; .Creator: F:TALI; Washability: OK; Mount: Surface Mount; Case/Package: Nonstandard; Number of Pins: 2; Case Code (Metric): 1608; Min Operating Temperature: -40°C; Max Operating Temperature: 125°C; Max DC Current: 200mA; Inductance Tolerance: 10%; Self Resonant Frequency: 5MHz; Packaging: Tape and Reel; Package Quantity: 1000; Current Rating: 200mA; Composition: Wirewound; Termination: SMD/SMT; DC Current: 200mA; Military Standard: Not; RMS Current (Irms): 200mA; Length: 6.5mm; Height: 3.3mm; Width: 6.5mm; Height - Seated (Max): 0.13inch; Depth: 6.7mm; REACH SVHC: No SVHC; Lead Free: Lead Free; ComponentLink1URL: http://www.bourns.com/pdfs/SRR0603.pdf; ComponentLink1Description: http://www.bourns.com/pdfs/SRR0603.pdf; ComponentLink2URL: http://www.bourns.com/docs/Product-Datasheets/SRR0603.pdf; ComponentLink2Description: http://www.bourns.com/docs/Product-Datasheets/SRR0603.pdf; .SCHCHK: USED; Supplier 1: Digi-Key; Supplier Part Number 1: 587-6091-1-ND; Stock: 5805; Pricing: 1=0.29, 10=0.261, 100=0.1793, 500=0.1532, 1000=0.1174 (USD); RoHS: Yes; ComponentLink3URL: http://www.yuden.co.jp/ut/product/category/inductor/NRS4018T101MDGJ.pdf?src-supplier=Avnet+Asia; ComponentLink3Description: http://www.yuden.co.jp/ut/product/category/inductor/NRS4018T101MDGJ.pdf?src-supplier=Avnet+Asia; ComponentLink4URL: http://www.yuden.co.jp/productdata/catalog/en/wound04_hq_e.pdf?src-supplier=Digi-Key; ComponentLink4Description: http://www.yuden.co.jp/productdata/catalog/en/wound04_hq_e.pdf?src-supplier=Digi-Key; Inductance: 220uH
footprint L-6.5x6.5mm
pins: 1, 2

## LED-7SEGMENT
designator S?, comment 7SEGMENT
DISPLAY 7SEG 10MM SUPER RED C.A.; Manufacturer: Vishay Semiconductors; Manufacturer Part Number: VDMR10A1; Number of Characters: 1; Max Power Dissipation: 70mW; Luminous Intensity: 1.6mcd; Forward Voltage: 2V; Wavelength: 631nm; Element Configuration: Common Anode; Forward Current: 20mA; .Creator: F:TALI; .PCBCHK: USED; Washability: OK; Supplier 1: Digi-Key; Stock 1: 737; Pricing 1: 1=2.2, 10=1.951, 25=1.4472, 100=1.2584, 250=1.13256 (USD); Case/Package: SMD/SMT; Number of Pins: 10; Color: Red; Min Operating Temperature: -35°C; Max Operating Temperature: 105°C; Package Quantity: 1; Packaging: Tape and Reel; Viewing Area (height): 10mm; Illumination Color: Red; Power Consumption: 70mW; Test Current: 20mA; Dominant Wavelength: 631nm; Height: 0.512inch; Width: 0.386inch; Radiation Hardening: No; REACH SVHC: Unknown; Lead Free: Lead Free; ComponentLink1URL: http://www.farnell.com/datasheets/1913357.pdf; ComponentLink1Description: http://www.farnell.com/datasheets/1913357.pdf; ComponentLink2URL: http://www.mouser.com/ds/2/427/vdmx10x0-272413.pdf; ComponentLink2Description: http://www.mouser.com/ds/2/427/vdmx10x0-272413.pdf; ComponentLink3URL: http://www.vishay.com/docs/84197/vdmx10a1.pdf; ComponentLink3Description: http://www.vishay.com/docs/84197/vdmx10a1.pdf; Supplier Part Number 1: VDMR10A1DKR-ND; .SCHCHK: USED
footprint LED-7SEGMENT-RM-V2
pins: 1 E, 2 D, 3 VCC1, 4 C, 5 DP, 6 B, 7 A, 8 VCC2, 9 F, 10 G

## LED-AMBER-0603
designator D?, comment ASMT-RA45-AP932  Forward Voltage: 2V  Case Code (Imperial): 0603